# Altium footprint library lib_protel_HC_BOINA.PCBLIB: 726 footprints (part 24 of 46)
Each footprint in its own frame and in the unit in brackets; x right, y up, seen from the top. Pads: shape width x height; smd on the part's side, far side on the other; paste and mask are expansions set on the pad; w line width, h text height; cw(c..) or ccw(c..) is an arc to the next point about the centre after c.
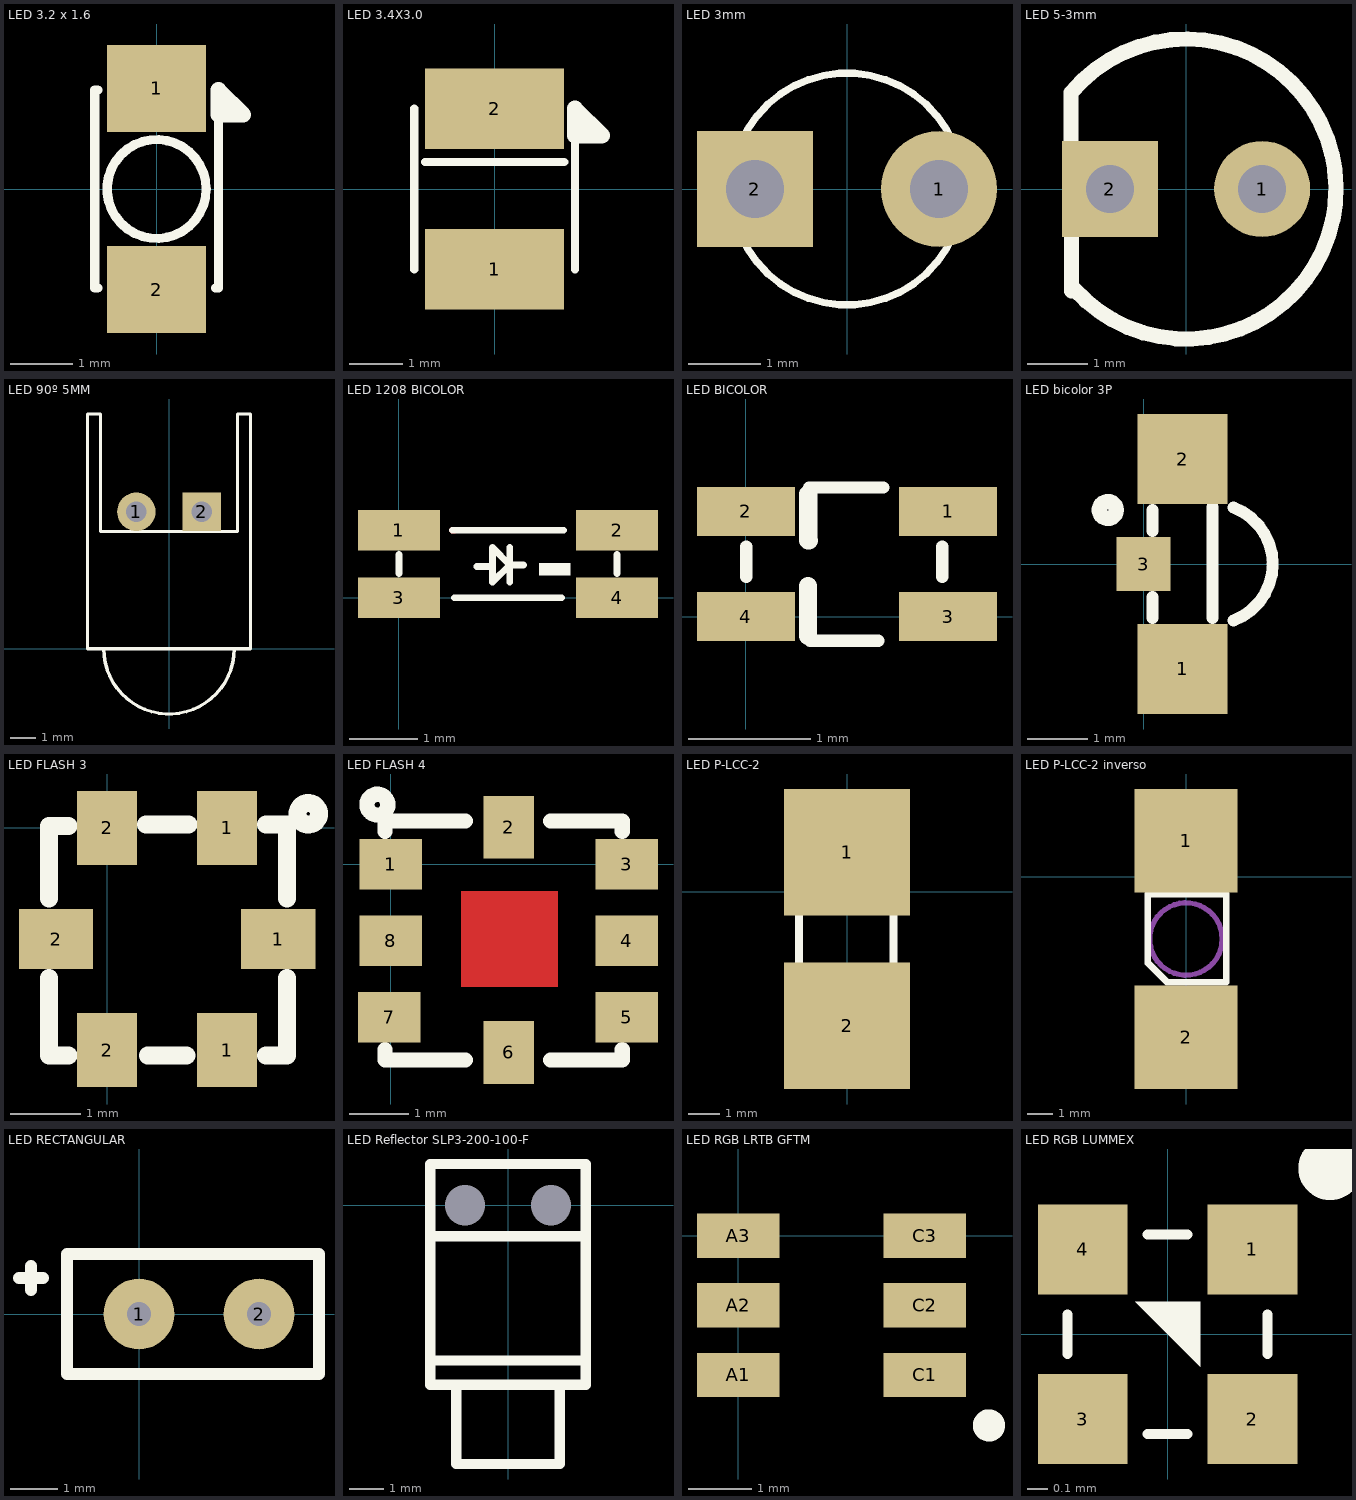
[diagram p23: the footprints below, top view; thin cyan lines are the x and y axes]

## LED 3.2 x 1.6 [mm]
height 1.9
pads (2):
  rect 1.6x1.4 smd: 1(0,1.625) 2(0,-1.625)
Top Overlay:
  circle w0.15: c0,0 r0.8
  lines w0.15: -0.95,-1.6 -1,-1.6 -1,1.6 -0.95,1.6 ; 0.95,-1.6 1,-1.6 1,1.6 0.95,1.6
  lines w0.254: 1,1.2 1,1.6 1.4,1.2 1,1.2
3D body "LED 1206 Blu.stp": height 1.1, standoff 0, extent -0.82,-1.612 0.78,1.588

## LED 3.4X3.0 [mm]
height 2.1
pads (2):
  rect 2.6x1.5 smd: 1(0,-1.5) 2(0,1.5)
Top Overlay:
  lines w0.15: -1.5,-1.5 -1.5,1.5 ; -1.3,0.5 1.3,0.5 ; 1.5,-1.5 1.5,1.5
  lines w0.3: 2,1 1.5,1 1.5,1.5 2,1 ; 2,1 2,1
3D body "User Library-LS T67F-T2V2-1.step": height 1.9, standoff 0, extent -1.4,-1.75 1.4,1.75

## LED 3mm [mm] "led de 3mm"
pads (2):
  round 1.6 hole 0.8: 1(1.27,0)
  rect 1.6x1.6 hole 0.8: 2(-1.27,0)
Top Overlay:
  circle w0.1: c0,0 r1.6

## LED 5-3mm [mm]
pads (2):
  round 1.6 hole 0.8: 1(1.27,0)
  rect 1.6x1.6 hole 0.8: 2(-1.27,0)
Top Overlay:
  lines w0.25: -1.915,1.607 -1.905,-1.702
  lines w0.254: -1.915,1.607 cw(c0,0) -1.864,-1.666

## LED 90º 5MM [mm] "LED AVAGO EN ANGULO DE 5MM."
height 6.3
pads (2):
  round 1.5 hole 0.8: 1(-1.27,5.334)
  rect 1.5x1.5 hole 0.8: 2(1.27,5.334)
Top Overlay:
  lines w0.127: -2.54,0 ccw(c0,0) 2.54,0 ; -3.175,0 3.175,0 3.175,9.144 2.667,9.144 2.667,4.572 -2.667,4.572 -2.667,9.144 -3.175,9.144 -3.175,0

## LED 1208 BICOLOR [mm] "LED BICOLOR RIGHT ANGLE DIALIGHT"
height 1.48
pads (4):
  rect 1.2x0.6 smd: 1(0,0.991) 2(3.2,0.991) 3(0,0) 4(3.2,0)
Top Layer:
  lines w0.1: 0.787,0.991 0.813,0.991
Top Overlay:
  region: 2.057,0.508 2.515,0.508 2.515,0.33 2.057,0.33
  lines w0.1: 0,0.356 0,0.635 ; 0.787,0.991 2.413,0.991 ; 0.813,0 2.388,0 ; 1.143,0.457 1.372,0.457 ; 1.626,0.229 1.626,0.737 1.626,0.483 ; 1.829,0.483 1.626,0.483 ; 3.2,0.356 3.2,0.635 ; 1.626,0.483 1.372,0.229 1.372,0.686 1.372,0.737 1.626,0.483

## LED BICOLOR [mm] "LED BICOLOR"
height 1.48
pads (4):
  rect 0.8x0.4 smd: 1(1.65,0.86) 2(0,0.86) 3(1.65,0) 4(0,0)
Top Overlay:
  lines w0.1: 0.002,0.325 0.002,0.573 ; 0.514,1.054 1.121,1.054 ; 0.523,-0.196 1.081,-0.196 ; 1.602,0.325 1.602,0.573
  lines w0.15: 0.506,-0.157 0.506,0.25 ; 0.51,1 0.51,0.625 0.513,0.622

## LED bicolor 3P [mm] "Led bicolor 3P ang. recto 3mm x 2mm"
height 1
pads (3):
  rect 1.5x1.5 smd: 1(0.65,-1.75) 2(0.65,1.75)
  rect 0.9x0.9 smd: 3(0,0)
Top Overlay:
  circle w0.254: c-0.6,0.9 r0.141
  lines w0.2: 0.15,-0.9 0.15,-0.55 ; 0.15,0.55 0.15,0.9 ; 1.15,-0.9 1.15,0.95 ; 1.495,0.939 cw(c1.15,0) 1.496,-0.938
3D body "1208_single.stp": height 0.99, standoff 0, extent 0.137,-1.511 2.258,1.511

## LED FLASH 3 [mm]
height 1.5
pads (6):
  rect 0.85x1.05 smd paste+0.1 mask+0.1: 1(1.7,-3.15) 1(1.7,0) 2(0,-3.15) 2(0,0)
  rect 1.05x0.85 smd paste+0.1 mask+0.1: 1(2.425,-1.575) 2(-0.725,-1.575)
Top Overlay:
  circle w0.254: c2.85,0.2 r0.152
  lines w0.254: -0.825,-2.125 -0.825,-3.225 -0.55,-3.225 ; -0.825,-1 -0.825,0.025 -0.55,0.025 ; 0.55,0.05 1.15,0.05 ; 0.575,-3.225 1.125,-3.225 ; 2.25,-3.225 2.55,-3.225 2.55,-2.125 ; 2.25,0.05 2.55,0.05 2.55,-1

## LED FLASH 4 [mm]
height 1.5
pads (8):
  rect 1.05x0.85 smd paste+0.1 mask+0.1: 1(0,0) 3(3.95,0) 4(3.95,-1.28) 5(3.95,-2.56) 7(-0.025,-2.56) 8(0,-1.28)
  rect 0.85x1.05 smd paste+0.1 mask+0.1: 2(1.975,0.62) 6(1.975,-3.15)
Top Layer:
  rectangle: 1.175,-2.05 2.8,-0.45
Top Overlay:
  circle w0.254: c-0.225,1 r0.175
  lines w0.254: -0.1,-3.1 -0.1,-3.275 1.25,-3.275 ; -0.1,0.55 -0.1,0.725 1.25,0.725 ; 2.675,-3.275 3.875,-3.275 3.875,-3.1 ; 2.675,0.725 3.875,0.725 3.875,0.55
3D body: height 1.5, standoff 0, extent -0.038,-3.265 3.962,0.735

## LED P-LCC-2 [mm] "LED SMD"
height 2.1
pads (2):
  rect 4x4 smd mask+0.1: 1(0,1.245) 2(0,-4.242)
Top Overlay:
  lines w0.254: -1.524,-2.54 -0.889,-3.175 1.476,-3.175 1.476,0.225 -1.524,0.225 -1.524,-2.54

## LED P-LCC-2 inverso [mm] "LED SMD inverso"
height 2.1
pads (2):
  rect 4x4 smd mask+0.1: 1(0,1.397) 2(0,-6.198)
Top Overlay:
  lines w0.254: -1.473,-3.327 -1.473,-0.66 1.549,-0.66 1.549,-4.064 -0.737,-4.064 -1.473,-3.327
Mechanical 1:
  circle w0.203: c0,-2.4 r1.4

## LED RECTANGULAR [mm] "LED RECTANGULAR 2,54mm"
height 8
pads (2):
  round 1.5 hole 0.5: 1(0,0) 2(2.54,0)
Top Overlay:
  lines w0.254: -2.54,0.762 -2.032,0.762 ; -2.286,0.508 -2.286,1.016 ; -1.524,-1.27 -1.524,1.27 3.81,1.27 3.81,-1.27 -1.524,-1.27

## LED Reflector SLP3-200-100-F [mm]
height 6.6
pads (2):
  round 0 hole 1.168: 0(-1.25,0) 0(1.25,0)
Top Overlay:
  lines w0.3: -2.25,-4.5 2.25,-4.5 ; -2.25,-0.9 2.25,-0.9 ; -1.5,-5.2 -1.5,-7.5 1.5,-7.5 1.5,-5.2 ; -2.25,-5.2 -2.25,1.2 2.25,1.2 2.25,-5.2 -2.25,-5.2
3D body "User Library-SLP3-200-100-R.STEP": height 6.58, standoff -1.6, extent -2.25,-7.74 2.25,1.2

## LED RGB LRTB GFTM [mm] "Led RGB de Osram"
height 1.8
pads (6):
  rect 1.3x0.7 smd: A1(0,-2.2) A2(0,-1.1) A3(0,0) C1(2.95,-2.2) C2(2.95,-1.1) C3(2.95,0)
Top Overlay:
  circle w0.254: c3.962,-2.997 r0.127

## LED RGB LUMMEX [mm] "SML-LX0404SIUPGUSB"
height 0.3
pads (4):
  rect 0.45x0.45 smd: 1(0.425,0.425) 2(0.425,-0.425) 3(-0.425,-0.425) 4(-0.425,0.425)
Top Overlay:
  circle w0.279: c0.815,0.832 r0.02
  region: 0.162,0.162 0.162,-0.163 -0.163,0.162
  lines w0.05: -0.5,-0.1 -0.5,0.1 ; -0.1,-0.5 0.1,-0.5 ; -0.1,0.5 0.1,0.5 ; 0.5,-0.1 0.5,0.1
3D body: height 0.12, standoff 0, extent -0.484,-0.514 0.516,0.486
3D body: height 0.15, standoff 0.12, extent 0.216,0.186 0.516,0.486
3D body: height 0.15, standoff 0.12, extent -0.484,0.186 -0.184,0.486
3D body: height 0.15, standoff 0.12, extent -0.484,-0.514 -0.184,-0.214
3D body: height 0.15, standoff 0.12, extent 0.216,-0.514 0.516,-0.214
3D body: height 0.15, standoff 0.13, extent -0.484,-0.364 0.516,0.336
3D body: height 0.25, standoff 0.15, extent -0.484,-0.364 0.516,0.336
3D body: height 0.2, standoff 0.15, extent -0.169,-0.069 0.201,0.041
3D body: height 0.2, standoff 0.15, extent -0.119,0.061 0.156,0.171
3D body: height 0.2, standoff 0.15, extent -0.119,-0.199 0.156,-0.089
3D body: height 0.13, standoff 0, extent -0.479,-0.509 0.511,0.481